# Altium footprint library Sockets.PcbLib: 80 footprints (part 5 of 6) (continued)
## TYCO_1415044-1 [mm] "Through Hole Round Socket for Relay 11 Pins, MT78603"
height 15.2
pads (11):
  round 3 hole 1.5: 1(-10.554,-3.099) 2(-7.203,-8.313) 3(-1.565,-10.888) 4(4.57,-10.006) 5(9.254,-5.947) 6(11,0) 7(9.254,5.947) 8(4.57,10.006) 9(-1.565,10.888) 10(-7.203,8.313) 11(-10.554,3.099)
Top Overlay:
  circle w0.2: c0,0 r14
  circle w0.2: c0,0 r5.6
  lines w0.2: -12.159,1.991 -12.095,1.623 -11.872,1.662 ; -11.304,-4.899 -11.054,-5.173 -10.888,-5.02 ; -9.799,1.301 ccw(c-9.125,2.642) -7.647,2.389 -5.985,2.675 -6.155,3.661 -7.816,3.374 ccw(c-9.125,2.642) -8.896,4.124 ; -9.715,-1.339 cw(c-9.105,-2.71) -8.4,-1.386 -7.157,-0.247 -6.482,-0.985 -7.725,-2.123 cw(c-9.105,-2.71) -8.946,-4.201 ; -9.152,8.249 -9.299,7.903 -9.089,7.814 ; -7.541,6.393 ccw(c-6.249,7.155) -5.142,6.143 -3.59,5.486 -3.2,6.407 -4.752,7.064 ccw(c-6.249,7.155) -5.254,8.277 ; -7.45,-6.379 cw(c-6.196,-7.202) -6.318,-5.707 -5.888,-4.077 -4.921,-4.332 -5.351,-5.962 cw(c-6.196,-7.202) -5.254,-8.369 ; -6.859,-10.233 -6.504,-10.327 -6.447,-10.11 ; -5.435,-1.35 -3.871,-1.35 ccw(c0,0) -3.871,1.35 -5.435,1.35 ; -3.422,11.486 -3.551,11.676 -3.239,11.889 ; -2.889,9.456 ccw(c-1.39,9.398) -1.005,7.948 -0.055,6.556 0.771,7.12 -0.18,8.512 ccw(c-1.39,9.398) 0.054,9.802 ; -2.82,-9.395 cw(c-1.32,-9.408) -2.231,-8.216 -2.75,-6.612 -1.798,-6.305 -1.28,-7.908 cw(c-1.32,-9.408) 0.104,-9.88 ; -0.237,-12.316 0.11,-12.203 0.042,-11.992 ; 2.682,9.518 ccw(c3.91,8.658) 3.45,7.23 3.498,5.545 4.497,5.573 4.45,7.258 ccw(c3.91,8.658) 5.344,8.216 ; 2.707,-9.43 cw(c3.975,-8.629) 2.564,-8.118 1.261,-7.05 1.895,-6.276 3.198,-7.345 cw(c3.975,-8.629) 5.428,-8.255 ; 3.33,11.511 3.323,11.743 3.704,11.753 ; 6.459,-10.488 6.689,-10.208 6.519,-10.068 ; 7.375,-6.471 cw(c8.008,-5.111) 6.546,-5.444 4.871,-5.25 4.987,-4.256 6.661,-4.451 cw(c8.008,-5.111) 9.027,-4.01 ; 7.402,6.559 ccw(c7.97,5.17) 6.811,4.218 5.94,2.775 6.796,2.258 7.667,3.701 ccw(c7.97,5.17) 8.936,4.023 ; 9.023,7.883 9.143,8.083 9.472,7.885 ; 9.691,-1.446 cw(c9.5,0.042) 8.451,-1.03 6.938,-1.774 6.497,-0.876 8.01,-0.133 cw(c9.5,0.042) 9.774,1.517 ; 10.928,-4.947 11.145,-4.972 11.104,-5.33 ; 11.851,1.754 12.062,1.858 12.232,1.512
  text "1" at -12.985,-3.645 h1.2
Mechanical 8:
  circle w0.05: c11,0 r0.75
  circle w0.05: c9.254,5.947 r0.75
  circle w0.05: c4.57,10.006 r0.75
  circle w0.05: c-1.565,10.888 r0.75
  circle w0.05: c-7.203,8.313 r0.75
  circle w0.05: c-10.554,3.099 r0.75
  circle w0.05: c-10.554,-3.099 r0.75
  circle w0.05: c-7.203,-8.313 r0.75
  circle w0.05: c-1.565,-10.888 r0.75
  circle w0.05: c4.57,-10.006 r0.75
  circle w0.05: c9.254,-5.947 r0.75
  lines w0.05: -11.054,-3.099 -10.554,-3.099 ; -11.054,3.099 -10.554,3.099 ; -10.554,-3.599 -10.554,-3.099 ; -10.554,-2.599 -10.554,-3.099 ; -10.554,2.599 -10.554,3.099 ; -10.554,3.599 -10.554,3.099 ; -10.054,-3.099 -10.554,-3.099 ; -10.054,3.099 -10.554,3.099 ; -7.703,-8.313 -7.203,-8.313 ; -7.703,8.313 -7.203,8.313 ; -7.203,-8.813 -7.203,-8.313 ; -7.203,-7.813 -7.203,-8.313 ; -7.203,7.813 -7.203,8.313 ; -7.203,8.813 -7.203,8.313 ; -6.703,-8.313 -7.203,-8.313 ; -6.703,8.313 -7.203,8.313 ; -2.065,-10.888 -1.565,-10.888 ; -2.065,10.888 -1.565,10.888 ; -1.565,-11.388 -1.565,-10.888 ; -1.565,-10.388 -1.565,-10.888 ; -1.565,10.388 -1.565,10.888 ; -1.565,11.388 -1.565,10.888 ; -1.065,-10.888 -1.565,-10.888 ; -1.065,10.888 -1.565,10.888 ; -0.5,0 0,0 ; 0,-0.5 0,0 ; 0,0.5 0,0 ; 0.5,0 0,0 ; 4.07,-10.006 4.57,-10.006 ; 4.07,10.006 4.57,10.006 ; 4.57,-10.506 4.57,-10.006 ; 4.57,-9.506 4.57,-10.006 ; 4.57,9.506 4.57,10.006 ; 4.57,10.506 4.57,10.006 ; 5.07,-10.006 4.57,-10.006 ; 5.07,10.006 4.57,10.006 ; 8.754,-5.947 9.254,-5.947 ; 8.754,5.947 9.254,5.947 ; 9.254,-6.447 9.254,-5.947 ; 9.254,-5.447 9.254,-5.947 ; 9.254,5.447 9.254,5.947 ; 9.254,6.447 9.254,5.947 ; 9.754,-5.947 9.254,-5.947 ; 9.754,5.947 9.254,5.947 ; 10.5,0 11,0 ; 11,-0.5 11,0 ; 11,0.5 11,0 ; 11.5,0 11,0
Mechanical 14:
  circle w0.1: c0,0 r14
  circle w0.1: c0,0 r5.6
  lines w0.1: -5.435,-1.35 -3.871,-1.35 ccw(c0,0) -3.871,1.35 -5.435,1.35 ; -12.265,2.609 -12.095,1.623 -10.434,1.909 ccw(c-9.125,2.642) -7.647,2.389 -5.985,2.675 -6.155,3.661 -7.816,3.374 ccw(c-9.125,2.642) -10.604,2.895 -12.265,2.609 ; -11.729,-4.435 -11.054,-5.173 -9.81,-4.034 ccw(c-9.105,-2.71) -7.725,-2.123 -6.482,-0.985 -7.157,-0.247 -8.4,-1.386 ccw(c-9.105,-2.71) -10.486,-3.296 -11.729,-4.435 ; -9.299,7.903 -7.747,7.246 ccw(c-6.249,7.155) -5.142,6.143 -3.59,5.486 -3.2,6.407 -4.752,7.064 ccw(c-6.249,7.155) -7.357,8.167 -8.909,8.824 -9.299,7.903 ; -7.471,-10.071 -6.504,-10.327 -6.073,-8.697 ccw(c-6.196,-7.202) -5.351,-5.962 -4.921,-4.332 -5.888,-4.077 -6.318,-5.707 ccw(c-6.196,-7.202) -7.04,-8.441 -7.471,-10.071 ; -3.551,11.676 -2.6,10.284 ccw(c-1.39,9.398) -1.005,7.948 -0.055,6.556 0.771,7.12 -0.18,8.512 ccw(c-1.39,9.398) -1.775,10.848 -2.725,12.24 -3.551,11.676 ; -2.75,-6.612 -2.231,-8.216 ccw(c-1.32,-9.408) -1.36,-10.907 -0.841,-12.511 0.11,-12.203 -0.409,-10.6 ccw(c-1.32,-9.408) -1.28,-7.908 -1.798,-6.305 -2.75,-6.612 ; 1.261,-7.05 2.564,-8.119 ccw(c3.975,-8.629) 4.751,-9.912 6.055,-10.981 6.689,-10.208 5.385,-9.139 ccw(c3.975,-8.629) 3.198,-7.345 1.895,-6.276 1.261,-7.05 ; 3.323,11.743 3.371,10.057 ccw(c3.91,8.658) 3.45,7.23 3.498,5.545 4.497,5.573 4.45,7.258 ccw(c3.91,8.658) 4.37,10.086 4.323,11.771 3.323,11.743 ; 4.871,-5.25 6.546,-5.444 ccw(c8.008,-5.111) 9.355,-5.771 11.03,-5.966 11.145,-4.972 9.471,-4.778 ccw(c8.008,-5.111) 6.661,-4.451 4.987,-4.256 4.871,-5.25 ; 5.94,2.775 6.811,4.218 cw(c7.97,5.17) 8.272,6.639 9.143,8.083 10,7.566 9.129,6.123 cw(c7.97,5.17) 7.667,3.701 6.796,2.258 5.94,2.775 ; 6.497,-0.876 8.01,-0.133 cw(c9.5,0.042) 10.549,1.114 12.062,1.858 12.503,0.96 10.99,0.217 cw(c9.5,0.042) 8.451,-1.03 6.938,-1.774 6.497,-0.876
  text "1" at -12.985,-3.645 h1.2
3D body "TYCO_1415044-1.stp": height 15.15, standoff -3.35, extent -13.999,-13.999 13.999,13.998

## TYCO_1415044-1_A [mm] "Through Hole Round Socket for Relay 11 Pins, MT78603"
height 15.2
Top Overlay:
  circle w0.2: c0,0 r14
  circle w0.2: c0,0 r5.6
  lines w0.2: -12.159,1.991 -12.095,1.623 -11.872,1.662 ; -11.304,-4.899 -11.054,-5.173 -10.888,-5.02 ; -9.799,1.301 ccw(c-9.125,2.642) -7.647,2.389 -5.985,2.675 -6.155,3.661 -7.816,3.374 ccw(c-9.125,2.642) -8.896,4.124 ; -9.715,-1.339 cw(c-9.105,-2.71) -8.4,-1.386 -7.157,-0.247 -6.482,-0.985 -7.725,-2.123 cw(c-9.105,-2.71) -8.946,-4.201 ; -9.152,8.249 -9.299,7.903 -9.089,7.814 ; -7.541,6.393 ccw(c-6.249,7.155) -5.142,6.143 -3.59,5.486 -3.2,6.407 -4.752,7.064 ccw(c-6.249,7.155) -5.254,8.277 ; -7.45,-6.379 cw(c-6.196,-7.202) -6.318,-5.707 -5.888,-4.077 -4.921,-4.332 -5.351,-5.962 cw(c-6.196,-7.202) -5.254,-8.369 ; -6.859,-10.233 -6.504,-10.327 -6.447,-10.11 ; -5.435,-1.35 -3.871,-1.35 ccw(c0,0) -3.871,1.35 -5.435,1.35 ; -3.422,11.486 -3.551,11.676 -3.239,11.889 ; -2.889,9.456 ccw(c-1.39,9.398) -1.005,7.948 -0.055,6.556 0.771,7.12 -0.18,8.512 ccw(c-1.39,9.398) 0.054,9.802 ; -2.82,-9.395 cw(c-1.32,-9.408) -2.231,-8.216 -2.75,-6.612 -1.798,-6.305 -1.28,-7.908 cw(c-1.32,-9.408) 0.104,-9.88 ; -0.237,-12.316 0.11,-12.203 0.042,-11.992 ; 2.682,9.518 ccw(c3.91,8.658) 3.45,7.23 3.498,5.545 4.497,5.573 4.45,7.258 ccw(c3.91,8.658) 5.344,8.216 ; 2.707,-9.43 cw(c3.975,-8.629) 2.564,-8.118 1.261,-7.05 1.895,-6.276 3.198,-7.345 cw(c3.975,-8.629) 5.428,-8.255 ; 3.33,11.511 3.323,11.743 3.704,11.753 ; 6.459,-10.488 6.689,-10.208 6.519,-10.068 ; 7.375,-6.471 cw(c8.008,-5.111) 6.546,-5.444 4.871,-5.25 4.987,-4.256 6.661,-4.451 cw(c8.008,-5.111) 9.027,-4.01 ; 7.402,6.559 ccw(c7.97,5.17) 6.811,4.218 5.94,2.775 6.796,2.258 7.667,3.701 ccw(c7.97,5.17) 8.936,4.023 ; 9.023,7.883 9.143,8.083 9.472,7.885 ; 9.691,-1.446 cw(c9.5,0.042) 8.451,-1.03 6.938,-1.774 6.497,-0.876 8.01,-0.133 cw(c9.5,0.042) 9.774,1.517 ; 10.928,-4.947 11.145,-4.972 11.104,-5.33 ; 11.851,1.754 12.062,1.858 12.232,1.512
  text "1" at -12.985,-3.645 h1.2
Mechanical 8:
  circle w0.05: c11,0 r0.75
  circle w0.05: c9.254,5.947 r0.75
  circle w0.05: c4.57,10.006 r0.75
  circle w0.05: c-1.565,10.888 r0.75
  circle w0.05: c-7.203,8.313 r0.75
  circle w0.05: c-10.554,3.099 r0.75
  circle w0.05: c-10.554,-3.099 r0.75
  circle w0.05: c-7.203,-8.313 r0.75
  circle w0.05: c-1.565,-10.888 r0.75
  circle w0.05: c4.57,-10.006 r0.75
  circle w0.05: c9.254,-5.947 r0.75
  lines w0.05: -11.054,-3.099 -10.554,-3.099 ; -11.054,3.099 -10.554,3.099 ; -10.554,-3.599 -10.554,-3.099 ; -10.554,-2.599 -10.554,-3.099 ; -10.554,2.599 -10.554,3.099 ; -10.554,3.599 -10.554,3.099 ; -10.054,-3.099 -10.554,-3.099 ; -10.054,3.099 -10.554,3.099 ; -7.703,-8.313 -7.203,-8.313 ; -7.703,8.313 -7.203,8.313 ; -7.203,-8.813 -7.203,-8.313 ; -7.203,-7.813 -7.203,-8.313 ; -7.203,7.813 -7.203,8.313 ; -7.203,8.813 -7.203,8.313 ; -6.703,-8.313 -7.203,-8.313 ; -6.703,8.313 -7.203,8.313 ; -2.065,-10.888 -1.565,-10.888 ; -2.065,10.888 -1.565,10.888 ; -1.565,-11.388 -1.565,-10.888 ; -1.565,-10.388 -1.565,-10.888 ; -1.565,10.388 -1.565,10.888 ; -1.565,11.388 -1.565,10.888 ; -1.065,-10.888 -1.565,-10.888 ; -1.065,10.888 -1.565,10.888 ; -0.5,0 0,0 ; 0,-0.5 0,0 ; 0,0.5 0,0 ; 0.5,0 0,0 ; 4.07,-10.006 4.57,-10.006 ; 4.07,10.006 4.57,10.006 ; 4.57,-10.506 4.57,-10.006 ; 4.57,-9.506 4.57,-10.006 ; 4.57,9.506 4.57,10.006 ; 4.57,10.506 4.57,10.006 ; 5.07,-10.006 4.57,-10.006 ; 5.07,10.006 4.57,10.006 ; 8.754,-5.947 9.254,-5.947 ; 8.754,5.947 9.254,5.947 ; 9.254,-6.447 9.254,-5.947 ; 9.254,-5.447 9.254,-5.947 ; 9.254,5.447 9.254,5.947 ; 9.254,6.447 9.254,5.947 ; 9.754,-5.947 9.254,-5.947 ; 9.754,5.947 9.254,5.947 ; 10.5,0 11,0 ; 11,-0.5 11,0 ; 11,0.5 11,0 ; 11.5,0 11,0
Mechanical 14:
  circle w0.1: c0,0 r14
  circle w0.1: c0,0 r5.6
  lines w0.1: -5.435,-1.35 -3.871,-1.35 ccw(c0,0) -3.871,1.35 -5.435,1.35 ; -12.265,2.609 -12.095,1.623 -10.434,1.909 ccw(c-9.125,2.642) -7.647,2.389 -5.985,2.675 -6.155,3.661 -7.816,3.374 ccw(c-9.125,2.642) -10.604,2.895 -12.265,2.609 ; -11.729,-4.435 -11.054,-5.173 -9.81,-4.034 ccw(c-9.105,-2.71) -7.725,-2.123 -6.482,-0.985 -7.157,-0.247 -8.4,-1.386 ccw(c-9.105,-2.71) -10.486,-3.296 -11.729,-4.435 ; -9.299,7.903 -7.747,7.246 ccw(c-6.249,7.155) -5.142,6.143 -3.59,5.486 -3.2,6.407 -4.752,7.064 ccw(c-6.249,7.155) -7.357,8.167 -8.909,8.824 -9.299,7.903 ; -7.471,-10.071 -6.504,-10.327 -6.073,-8.697 ccw(c-6.196,-7.202) -5.351,-5.962 -4.921,-4.332 -5.888,-4.077 -6.318,-5.707 ccw(c-6.196,-7.202) -7.04,-8.441 -7.471,-10.071 ; -3.551,11.676 -2.6,10.284 ccw(c-1.39,9.398) -1.005,7.948 -0.055,6.556 0.771,7.12 -0.18,8.512 ccw(c-1.39,9.398) -1.775,10.848 -2.725,12.24 -3.551,11.676 ; -2.75,-6.612 -2.231,-8.216 ccw(c-1.32,-9.408) -1.36,-10.907 -0.841,-12.511 0.11,-12.203 -0.409,-10.6 ccw(c-1.32,-9.408) -1.28,-7.908 -1.798,-6.305 -2.75,-6.612 ; 1.261,-7.05 2.564,-8.119 ccw(c3.975,-8.629) 4.751,-9.912 6.055,-10.981 6.689,-10.208 5.385,-9.139 ccw(c3.975,-8.629) 3.198,-7.345 1.895,-6.276 1.261,-7.05 ; 3.323,11.743 3.371,10.057 ccw(c3.91,8.658) 3.45,7.23 3.498,5.545 4.497,5.573 4.45,7.258 ccw(c3.91,8.658) 4.37,10.086 4.323,11.771 3.323,11.743 ; 4.871,-5.25 6.546,-5.444 ccw(c8.008,-5.111) 9.355,-5.771 11.03,-5.966 11.145,-4.972 9.471,-4.778 ccw(c8.008,-5.111) 6.661,-4.451 4.987,-4.256 4.871,-5.25 ; 5.94,2.775 6.811,4.218 cw(c7.97,5.17) 8.272,6.639 9.143,8.083 10,7.566 9.129,6.123 cw(c7.97,5.17) 7.667,3.701 6.796,2.258 5.94,2.775 ; 6.497,-0.876 8.01,-0.133 cw(c9.5,0.042) 10.549,1.114 12.062,1.858 12.503,0.96 10.99,0.217 cw(c9.5,0.042) 8.451,-1.03 6.938,-1.774 6.497,-0.876
  text "1" at -12.985,-3.645 h1.2
3D body "TYCO_1415044-1.stp": height 15.15, standoff -3.35, extent -13.999,-13.999 13.999,13.998

## TYCO_1437504-6 [mm] "3 Leads Through-Hole TO-18 Socket"
height 4.95
pads (3):
  round 1.5 hole 0.8: 1(0,1.27) 2(-1.27,0) 3(0,-1.27)
Top Overlay:
  circle w0.3: c1.75,1.8 r0.15
  circle w0.2: c0,0 r3.239
Mechanical 8:
  lines w0.1: -1.77,0 -1.27,0 ; -1.27,-0.5 -1.27,0 ; -1.27,0.5 -1.27,0 ; -0.77,0 -1.27,0 ; -0.5,-1.27 0,-1.27 ; -0.5,0 0,0 ; -0.5,1.27 0,1.27 ; 0,-1.77 0,-1.27 ; 0,-0.77 0,-1.27 ; 0,-0.5 0,0 ; 0,0.5 0,0 ; 0,0.77 0,1.27 ; 0,1.77 0,1.27 ; 0.5,-1.27 0,-1.27 ; 0.5,0 0,0 ; 0.5,1.27 0,1.27
Mechanical 14:
  circle w0.3: c1.75,1.8 r0.15
  circle w0.1: c0,1.27 r0.5
  circle w0.1: c-1.27,0 r0.5
  circle w0.1: c0,-1.27 r0.5
  circle w0.1: c0,0 r3.239
3D body "TYCO_1437504-6.stp": height 4.95, standoff -2.61, extent -3.238,-3.238 3.239,3.239

## TYCO_1437504-6_a [mm] "3 Leads Through-Hole TO-18 Socket"
height 4.95
Top Overlay:
  circle w0.2: c0,0 r3.239
  circle w0.3: c1.75,1.8 r0.15
Mechanical 8:
  lines w0.1: -1.77,0 -1.27,0 ; -1.27,-0.5 -1.27,0 ; -1.27,0.5 -1.27,0 ; -0.77,0 -1.27,0 ; -0.5,-1.27 0,-1.27 ; -0.5,0 0,0 ; -0.5,1.27 0,1.27 ; 0,-1.77 0,-1.27 ; 0,-0.77 0,-1.27 ; 0,-0.5 0,0 ; 0,0.5 0,0 ; 0,0.77 0,1.27 ; 0,1.77 0,1.27 ; 0.5,-1.27 0,-1.27 ; 0.5,0 0,0 ; 0.5,1.27 0,1.27
Mechanical 14:
  circle w0.1: c0,0 r3.239
  circle w0.1: c0,-1.27 r0.5
  circle w0.1: c-1.27,0 r0.5
  circle w0.1: c0,1.27 r0.5
  circle w0.3: c1.75,1.8 r0.15
3D body "TYCO_1437504-6.stp": height 4.95, standoff -2.61, extent -3.238,-3.238 3.239,3.239

## TYCO_1473005-4 [mm] "DDR2 SODIMM Socket 0.6mm Pitch 200 Positions"
height 5.2
pads (204):
  rect 0.35x2 smd: 1(-31.65,-4.1) 2(-31.35,4.1) 3(-31.05,-4.1) 4(-30.75,4.1) 5(-30.45,-4.1) 6(-30.15,4.1) 7(-29.85,-4.1) 8(-29.55,4.1) 9(-29.25,-4.1) 10(-28.95,4.1) 11(-28.65,-4.1) 12(-28.35,4.1) 13(-28.05,-4.1) 14(-27.75,4.1) 15(-27.45,-4.1) 16(-27.15,4.1) 17(-26.85,-4.1) 18(-26.55,4.1) 19(-26.25,-4.1) 20(-25.95,4.1) 21(-25.65,-4.1) 22(-25.35,4.1) 23(-25.05,-4.1) 24(-24.75,4.1) 25(-24.45,-4.1) 26(-24.15,4.1) 27(-23.85,-4.1) 28(-23.55,4.1) 29(-23.25,-4.1) 30(-22.95,4.1) 31(-22.65,-4.1) 32(-22.35,4.1) 33(-22.05,-4.1) 34(-21.75,4.1) 35(-21.45,-4.1) 36(-21.15,4.1) 37(-20.85,-4.1) 38(-20.55,4.1) 39(-20.25,-4.1) 40(-19.95,4.1) 41(-16.05,-4.1) 42(-15.75,4.1) 43(-15.45,-4.1) 44(-15.15,4.1) 45(-14.85,-4.1) 46(-14.55,4.1) 47(-14.25,-4.1) 48(-13.95,4.1) 49(-13.65,-4.1) 50(-13.35,4.1) 51(-13.05,-4.1) 52(-12.75,4.1) 53(-12.45,-4.1) 54(-12.15,4.1) 55(-11.85,-4.1) 56(-11.55,4.1) 57(-11.25,-4.1) 58(-10.95,4.1) 59(-10.65,-4.1) 60(-10.35,4.1) 61(-10.05,-4.1) 62(-9.75,4.1) 63(-9.45,-4.1) 64(-9.15,4.1) 65(-8.85,-4.1) 66(-8.55,4.1) 67(-8.25,-4.1) 68(-7.95,4.1) 69(-7.65,-4.1) 70(-7.35,4.1) 71(-7.05,-4.1) 72(-6.75,4.1) 73(-6.45,-4.1) 74(-6.15,4.1) 75(-5.85,-4.1) 76(-5.55,4.1) 77(-5.25,-4.1) 78(-4.95,4.1) 79(-4.65,-4.1) 80(-4.35,4.1) 81(-4.05,-4.1) 82(-3.75,4.1) 83(-3.45,-4.1) 84(-3.15,4.1) 85(-2.85,-4.1) 86(-2.55,4.1) 87(-2.25,-4.1) 88(-1.95,4.1) 89(-1.65,-4.1) 90(-1.35,4.1) 91(-1.05,-4.1) 92(-0.75,4.1) 93(-0.45,-4.1) 94(-0.15,4.1) 95(0.15,-4.1) 96(0.45,4.1) 97(0.75,-4.1) 98(1.05,4.1) 99(1.35,-4.1) 100(1.65,4.1) 101(1.95,-4.1) 102(2.25,4.1) 103(2.55,-4.1) 104(2.85,4.1) 105(3.15,-4.1) 106(3.45,4.1) 107(3.75,-4.1) 108(4.05,4.1) 109(4.35,-4.1) 110(4.65,4.1) 111(4.95,-4.1) 112(5.25,4.1) 113(5.55,-4.1) 114(5.85,4.1) 115(6.15,-4.1) 116(6.45,4.1) 117(6.75,-4.1) 118(7.05,4.1) 119(7.35,-4.1) 120(7.65,4.1) 121(7.95,-4.1) 122(8.25,4.1) 123(8.55,-4.1) 124(8.85,4.1) 125(9.15,-4.1) 126(9.45,4.1) 127(9.75,-4.1) 128(10.05,4.1) 129(10.35,-4.1) 130(10.65,4.1) 131(10.95,-4.1) 132(11.25,4.1) 133(11.55,-4.1) 134(11.85,4.1) 135(12.15,-4.1) 136(12.45,4.1) 137(12.75,-4.1) 138(13.05,4.1) 139(13.35,-4.1) 140(13.65,4.1) 141(13.95,-4.1) 142(14.25,4.1) 143(14.55,-4.1) 144(14.85,4.1) 145(15.15,-4.1) 146(15.45,4.1) 147(15.75,-4.1) 148(16.05,4.1) 149(16.35,-4.1) 150(16.65,4.1) 151(16.95,-4.1) 152(17.25,4.1) 153(17.55,-4.1) 154(17.85,4.1) 155(18.15,-4.1) 156(18.45,4.1) 157(18.75,-4.1) 158(19.05,4.1) 159(19.35,-4.1) 160(19.65,4.1) 161(19.95,-4.1) 162(20.25,4.1) 163(20.55,-4.1) 164(20.85,4.1) 165(21.15,-4.1) 166(21.45,4.1) 167(21.75,-4.1) 168(22.05,4.1) 169(22.35,-4.1) 170(22.65,4.1) 171(22.95,-4.1) 172(23.25,4.1) 173(23.55,-4.1) 174(23.85,4.1) 175(24.15,-4.1) 176(24.45,4.1) 177(24.75,-4.1) 178(25.05,4.1) 179(25.35,-4.1) 180(25.65,4.1) 181(25.95,-4.1) 182(26.25,4.1) 183(26.55,-4.1) 184(26.85,4.1) 185(27.15,-4.1) 186(27.45,4.1) 187(27.75,-4.1) 188(28.05,4.1) 189(28.35,-4.1) 190(28.65,4.1) 191(28.95,-4.1) 192(29.25,4.1) 193(29.55,-4.1) 194(29.85,4.1) 195(30.15,-4.1) 196(30.45,4.1) 197(30.75,-4.1) 198(31.05,4.1) 199(31.35,-4.1) 200(31.65,4.1)
  round 0.5 hole 1.1 unplated: 201(33.4,0)
  round 0.5 hole 1.6 unplated: 202(-33.4,0)
  rect 4x4.6 smd: 203(-32.3,12) 204(32.3,12)
Top Overlay:
  lines w0.2: -35.4,9.85 -35.4,16.45 -35.75,16.45 -35.75,9.85 ccw(c-35.05,9.85) -35.532,9.342 -34.859,8.704 cw(c-35.1,8.45) -34.75,8.45 -34.75,1.85 ; -35.4,10 -34.798,10 ; -35.4,14 -34.798,14 ; -35.4,14.45 -34.798,14.45 ; -35.4,15.45 -33.1,15.45 -33.1,14.859 ; -35.291,9.596 -34.618,8.958 cw(c-35.1,8.45) -34.4,8.45 -34.4,6.9 -34.3,6.9 -34.3,9.144 ; -34.42,15.805 -34.002,20.587 cw(c-33.504,20.544) -33.46,21.042 -32.669,20.973 cw(c-37.159,18.786) -32.21,18.122 -33.007,18.191 -33.042,17.793 -32.444,17.741 -32.488,17.242 -32.766,15.761 -33.614,15.835 -33.649,15.437 ; -34.147,15.48 -33.648,15.45 ; -33.95,9.144 -33.95,3.7 -33.03,3.7 -33.03,1.85 ; -32.35,1.85 -32.35,3.7 -31.925,3.7 ; -32.225,-3.3 -32.35,-3.3 -32.35,-5 -35.5,-5 -35.5,1.85 35.5,1.85 35.5,-5 32.35,-5 32.35,-3.3 31.925,-3.3 ; -19.675,-3.3 -16.625,-3.3 ; -19.375,3.7 -16.325,3.7 ; -18,1.85 -18,3.3 ; -17.1,1.85 -17.1,3.3 ; 32.225,3.7 32.35,3.7 32.35,1.85 ; 33.03,1.85 33.03,3.7 33.95,3.7 33.95,9.144 ; 33.1,14.859 33.1,15.45 35.4,15.45 ; 33.648,15.45 34.147,15.48 ; 33.649,15.437 33.614,15.835 32.766,15.761 32.488,17.242 32.444,17.741 33.042,17.793 33.007,18.191 32.21,18.122 cw(c37.159,18.786) 32.669,20.973 33.46,21.042 cw(c33.504,20.544) 34.002,20.587 34.42,15.805 ; 34.3,9.144 34.3,6.9 34.4,6.9 34.4,8.45 cw(c35.1,8.45) 34.618,8.958 35.291,9.596 ; 34.75,1.85 34.75,8.45 cw(c35.1,8.45) 34.859,8.704 35.532,9.342 ccw(c35.05,9.85) 35.75,9.85 35.75,16.45 35.4,16.45 35.4,9.85 ; 34.798,10 35.4,10 ; 34.798,14 35.4,14 ; 34.798,14.45 35.4,14.45
Mechanical 8:
  drawing of 812 lines, arcs and shapes, not listed
Mechanical 14:
  circle w0.1: c-33.4,0 r0.8
  circle w0.1: c33.4,0 r0.55
  lines w0.1: -35.4,9.85 -35.4,16.45 -35.75,16.45 -35.75,9.85 ccw(c-35.05,9.85) -35.532,9.342 -34.859,8.704 cw(c-35.1,8.45) -34.75,8.45 -34.75,1.85 ; -35.4,10 -31.725,10 -31.725,14 -35.4,14 ; -35.4,14.45 -33.1,14.45 -33.1,15.45 -35.4,15.45 ; -35.291,9.596 -34.618,8.958 cw(c-35.1,8.45) -34.4,8.45 -34.4,6.9 -34.3,6.9 -34.3,10 ; -34.42,15.805 -34.002,20.587 cw(c-33.504,20.544) -33.46,21.042 -32.669,20.973 cw(c-37.159,18.786) -32.21,18.122 -33.007,18.191 -33.042,17.793 -32.444,17.741 -32.488,17.242 -32.766,15.761 -33.614,15.835 -33.649,15.437 ; -34.147,15.48 -33.648,15.45 ; -33.95,10 -33.95,3.7 -33.03,3.7 -33.03,1.85 ; -32.35,1.85 -32.35,3.7 32.35,3.7 32.35,1.85 ; -18,1.85 -18,3.3 ; -17.1,1.85 -17.1,3.3 ; 33.03,1.85 33.03,3.7 33.95,3.7 33.95,10 ; 33.648,15.45 34.147,15.48 ; 33.649,15.437 33.614,15.835 32.766,15.761 32.488,17.242 32.444,17.741 33.042,17.793 33.007,18.191 32.21,18.122 cw(c37.159,18.786) 32.669,20.973 33.46,21.042 cw(c33.504,20.544) 34.002,20.587 34.42,15.805 ; 34.3,10 34.3,6.9 34.4,6.9 34.4,8.45 cw(c35.1,8.45) 34.618,8.958 35.291,9.596 ; 34.75,1.85 34.75,8.45 cw(c35.1,8.45) 34.859,8.704 35.532,9.342 ccw(c35.05,9.85) 35.75,9.85 35.75,16.45 35.4,16.45 35.4,9.85 ; 35.4,10 31.725,10 31.725,14 35.4,14 ; 35.4,14.45 33.1,14.45 33.1,15.45 35.4,15.45 ; -35.5,-5 -32.35,-5 -32.35,-3.3 32.35,-3.3 32.35,-5 35.5,-5 35.5,1.85 -35.5,1.85 -35.5,-5
3D body "TYCO_1473005-4.stp": height 5.38, standoff -1.05, extent -35.75,-5 35.75,21.042

## TYCO_1981284-4 [mm] "Right Angle DDR2 SODIMM Socket 0.6mm Pitch 200 Positions"
height 9.2
pads (204):
  rect 0.35x2 smd: 1(-31.65,-4.1) 2(-31.35,4.1) 3(-31.05,-4.1) 4(-30.75,4.1) 5(-30.45,-4.1) 6(-30.15,4.1) 7(-29.85,-4.1) 8(-29.55,4.1) 9(-29.25,-4.1) 10(-28.95,4.1) 11(-28.65,-4.1) 12(-28.35,4.1) 13(-28.05,-4.1) 14(-27.75,4.1) 15(-27.45,-4.1) 16(-27.15,4.1) 17(-26.85,-4.1) 18(-26.55,4.1) 19(-26.25,-4.1) 20(-25.95,4.1) 21(-25.65,-4.1) 22(-25.35,4.1) 23(-25.05,-4.1) 24(-24.75,4.1) 25(-24.45,-4.1) 26(-24.15,4.1) 27(-23.85,-4.1) 28(-23.55,4.1) 29(-23.25,-4.1) 30(-22.95,4.1) 31(-22.65,-4.1) 32(-22.35,4.1) 33(-22.05,-4.1) 34(-21.75,4.1) 35(-21.45,-4.1) 36(-21.15,4.1) 37(-20.85,-4.1) 38(-20.55,4.1) 39(-20.25,-4.1) 40(-19.95,4.1) 41(-16.05,-4.1) 42(-15.75,4.1) 43(-15.45,-4.1) 44(-15.15,4.1) 45(-14.85,-4.1) 46(-14.55,4.1) 47(-14.25,-4.1) 48(-13.95,4.1) 49(-13.65,-4.1) 50(-13.35,4.1) 51(-13.05,-4.1) 52(-12.75,4.1) 53(-12.45,-4.1) 54(-12.15,4.1) 55(-11.85,-4.1) 56(-11.55,4.1) 57(-11.25,-4.1) 58(-10.95,4.1) 59(-10.65,-4.1) 60(-10.35,4.1) 61(-10.05,-4.1) 62(-9.75,4.1) 63(-9.45,-4.1) 64(-9.15,4.1) 65(-8.85,-4.1) 66(-8.55,4.1) 67(-8.25,-4.1) 68(-7.95,4.1) 69(-7.65,-4.1) 70(-7.35,4.1) 71(-7.05,-4.1) 72(-6.75,4.1) 73(-6.45,-4.1) 74(-6.15,4.1) 75(-5.85,-4.1) 76(-5.55,4.1) 77(-5.25,-4.1) 78(-4.95,4.1) 79(-4.65,-4.1) 80(-4.35,4.1) 81(-4.05,-4.1) 82(-3.75,4.1) 83(-3.45,-4.1) 84(-3.15,4.1) 85(-2.85,-4.1) 86(-2.55,4.1) 87(-2.25,-4.1) 88(-1.95,4.1) 89(-1.65,-4.1) 90(-1.35,4.1) 91(-1.05,-4.1) 92(-0.75,4.1) 93(-0.45,-4.1) 94(-0.15,4.1) 95(0.15,-4.1) 96(0.45,4.1) 97(0.75,-4.1) 98(1.05,4.1) 99(1.35,-4.1) 100(1.65,4.1) 101(1.95,-4.1) 102(2.25,4.1) 103(2.55,-4.1) 104(2.85,4.1) 105(3.15,-4.1) 106(3.45,4.1) 107(3.75,-4.1) 108(4.05,4.1) 109(4.35,-4.1) 110(4.65,4.1) 111(4.95,-4.1) 112(5.25,4.1) 113(5.55,-4.1) 114(5.85,4.1) 115(6.15,-4.1) 116(6.45,4.1) 117(6.75,-4.1) 118(7.05,4.1) 119(7.35,-4.1) 120(7.65,4.1) 121(7.95,-4.1) 122(8.25,4.1) 123(8.55,-4.1) 124(8.85,4.1) 125(9.15,-4.1) 126(9.45,4.1) 127(9.75,-4.1) 128(10.05,4.1) 129(10.35,-4.1) 130(10.65,4.1) 131(10.95,-4.1) 132(11.25,4.1) 133(11.55,-4.1) 134(11.85,4.1) 135(12.15,-4.1) 136(12.45,4.1) 137(12.75,-4.1) 138(13.05,4.1) 139(13.35,-4.1) 140(13.65,4.1) 141(13.95,-4.1) 142(14.25,4.1) 143(14.55,-4.1) 144(14.85,4.1) 145(15.15,-4.1) 146(15.45,4.1) 147(15.75,-4.1) 148(16.05,4.1) 149(16.35,-4.1) 150(16.65,4.1) 151(16.95,-4.1) 152(17.25,4.1) 153(17.55,-4.1) 154(17.85,4.1) 155(18.15,-4.1) 156(18.45,4.1) 157(18.75,-4.1) 158(19.05,4.1) 159(19.35,-4.1) 160(19.65,4.1) 161(19.95,-4.1) 162(20.25,4.1) 163(20.55,-4.1) 164(20.85,4.1) 165(21.15,-4.1) 166(21.45,4.1) 167(21.75,-4.1) 168(22.05,4.1) 169(22.35,-4.1) 170(22.65,4.1) 171(22.95,-4.1) 172(23.25,4.1) 173(23.55,-4.1) 174(23.85,4.1) 175(24.15,-4.1) 176(24.45,4.1) 177(24.75,-4.1) 178(25.05,4.1) 179(25.35,-4.1) 180(25.65,4.1) 181(25.95,-4.1) 182(26.25,4.1) 183(26.55,-4.1) 184(26.85,4.1) 185(27.15,-4.1) 186(27.45,4.1) 187(27.75,-4.1) 188(28.05,4.1) 189(28.35,-4.1) 190(28.65,4.1) 191(28.95,-4.1) 192(29.25,4.1) 193(29.55,-4.1) 194(29.85,4.1) 195(30.15,-4.1) 196(30.45,4.1) 197(30.75,-4.1) 198(31.05,4.1) 199(31.35,-4.1) 200(31.65,4.1)
  round 0.5 hole 1.2 unplated: 201(33.4,0)
  round 0.5 hole 1.5 unplated: 202(-33.4,0)
  rect 4x4.6 smd: 203(-32.3,12) 204(32.3,12)
Top Overlay:
  lines w0.2: -34.75,1.85 -34.75,14.8 cw(c-34.15,14.8) -34.432,15.329 ccw(c-34.55,15.55) -34.3,15.55 ; -34.75,6.9 -33.95,6.9 ; -34.6,15.55 -34.6,17.85 ; -34.584,15.214 -34.053,15.214 ; -34.417,6.9 -34.417,9.271 ; -34.4,15.35 -33.984,15.35 ; -34.38,21.55 -34.38,18.35 -34.6,17.85 ; -34.321,15.45 -33.958,15.45 ; -34.317,6.9 -34.317,9.271 ; -33.95,1.85 -33.95,9.271 ; -33.95,5.35 -32.2,5.35 -32.2,1.85 ; -33.95,15.55 cw(c-34.55,15.55) -34.268,15.021 ccw(c-34.15,14.8) -34.4,14.8 -32.6,14.8 -32.6,14.605 ; -33.75,1.85 -33.75,5.35 ; -33.733,21.55 cw(c-33.735,21.057) -33.264,21.205 -32.764,19.643 ; -33.608,18.35 -33.59,17.85 -33.638,18.35 -32.907,19.029 ; -33.604,18.246 -33.577,18.35 ; -33.34,18.57 -32.9,18.5 -32.845,18.846 -33.014,18.872 ; -32.916,15.55 -32.916,17.85 ; -32.225,-3.7 -32.35,-3.7 -32.35,-5 -34.85,-5 -34.85,1.85 -17.6,1.85 -17.6,3.7 ccw(c-17.6,3.3) -18,3.3 -18,1.85 ; -19.675,-3.7 -16.625,-3.7 ; -19.375,3.7 -16.325,3.7 ; -18,1.9 -17.1,1.9 ; -17.1,1.85 -17.1,3.3 ccw(c-17.5,3.3) -17.5,3.7 -17.5,1.85 34.85,1.85 34.85,-5 32.35,-5 32.35,-3.7 31.925,-3.7 ; 32.2,1.85 32.2,5.35 33.95,5.35 ; 32.6,14.605 32.6,14.8 34.4,14.8 ccw(c34.15,14.8) 34.268,15.021 cw(c34.55,15.55) 33.95,15.55 ; 32.916,15.55 32.916,17.85 ; 33.014,18.872 32.845,18.846 32.9,18.5 33.34,18.57 ; 33.604,18.246 33.577,18.35 ; 33.608,18.35 33.59,17.85 33.638,18.35 32.907,19.029 ; 33.733,21.55 ccw(c33.735,21.057) 33.264,21.205 32.764,19.643 ; 33.75,1.85 33.75,5.35 ; 33.95,1.85 33.95,9.271 ; 33.95,6.9 34.75,6.9 ; 33.958,15.45 34.321,15.45 ; 33.984,15.35 34.4,15.35 ; 34.053,15.214 34.584,15.214 ; 34.3,6.9 34.3,9.271 ; 34.3,15.55 ccw(c34.55,15.55) 34.432,15.329 cw(c34.15,14.8) 34.75,14.8 34.75,1.85 ; 34.38,21.55 34.38,18.35 34.6,17.85 ; 34.4,6.9 34.4,9.271 ; 34.6,15.55 34.6,17.85 ; -34.83,17.85 -34.614,18.35 -34.614,21.479 ; -34.83,17.85 -34.8,18.35 ; -34.83,17.85 -34.83,15.55 -32.75,15.55 -32.75,17.85 -34.6,17.85 ; -34.8,18.35 -34.8,21.05 cw(c-34.252,21.067) -34.614,21.479 ; -34.8,18.35 -33.577,18.35 ; -34.614,21.479 cw(c-34.391,21.167) -34.371,21.55 -33.793,21.55 cw(c-33.796,21.057) -33.325,21.205 -32.825,19.643 ; -33.577,18.35 -32.846,19.029 ; -32.907,19.029 ccw(c-33.112,19.249) -32.811,19.25 ; -32.907,19.029 ccw(c-33.112,19.249) -32.811,19.25 ; -32.907,19.029 -32.846,19.029 ; -32.846,19.029 ccw(c-33.051,19.249) -32.75,19.25 ; -32.846,19.029 ccw(c-33.051,19.249) -32.75,19.25 ; -32.825,19.643 cw(c-33.088,19.554) -32.811,19.55 ; -32.825,19.643 -32.764,19.643 ; -32.811,19.25 -32.75,19.25 ; -32.811,19.25 -32.811,19.55 ; -32.811,19.25 -32.75,19.25 ; -32.811,19.55 -32.75,19.55 ; -32.764,19.643 cw(c-33.027,19.554) -32.75,19.55 ; -32.75,19.25 -32.75,19.55 ; 32.75,19.25 ccw(c33.051,19.249) 32.846,19.029 ; 32.75,19.25 ccw(c33.051,19.249) 32.846,19.029 ; 32.75,19.25 32.811,19.25 ; 32.75,19.25 32.75,19.55 ; 32.75,19.25 32.811,19.25 ; 32.75,19.55 cw(c33.027,19.554) 32.764,19.643 ; 32.75,19.55 32.811,19.55 ; 32.764,19.643 32.825,19.643 ; 32.811,19.25 ccw(c33.112,19.249) 32.907,19.029 ; 32.811,19.25 ccw(c33.112,19.249) 32.907,19.029 ; 32.811,19.25 32.811,19.55 ; 32.811,19.55 cw(c33.088,19.554) 32.825,19.643 ; 32.825,19.643 33.325,21.205 cw(c33.796,21.057) 33.793,21.55 34.371,21.55 cw(c34.391,21.167) 34.614,21.479 ; 32.846,19.029 33.577,18.35 ; 32.846,19.029 32.907,19.029 ; 33.577,18.35 34.8,18.35 ; 34.6,17.85 32.75,17.85 32.75,15.55 34.83,15.55 34.83,17.85 ; 34.614,21.479 cw(c34.252,21.067) 34.8,21.05 34.8,18.35 ; 34.614,21.479 34.614,18.35 34.83,17.85 ; 34.8,18.35 34.83,17.85 ; -32.6,-1.3 -31.85,-2.6 -31.1,-1.3 -32.6,-1.3
Mechanical 8:
  drawing of 466 lines, arcs and shapes, not listed
Mechanical 14:
  drawing of 1474 lines, arcs and shapes, not listed
3D body "TYCO_1981284-4.stp": height 9.55, standoff -0.65, extent -34.85,-5 34.85,21.55